# Altium footprint library CONN_B2B.PcbLib: 30 footprints (part 2 of 2) (continued)
## QTE_060_03 [mm] "samtec 0.80 mm Q Strip® High Speed Ground Plane Terminal Strip"
pads (134):
  oval 0.4x2.4 smd: 1(-27.6,3) 2(-27.6,-3) 3(-26.8,3) 4(-26.8,-3) 5(-26,3) 6(-26,-3) 7(-25.2,3) 8(-25.2,-3) 9(-24.4,3) 10(-24.4,-3) 11(-23.6,3) 12(-23.6,-3) 13(-22.8,3) 14(-22.8,-3) 15(-22,3) 16(-22,-3) 17(-21.2,3) 18(-21.2,-3) 19(-20.4,3) 20(-20.4,-3) 21(-19.6,3) 22(-19.6,-3) 23(-18.8,3) 24(-18.8,-3) 25(-18,3) 26(-18,-3) 27(-17.2,3) 28(-17.2,-3) 29(-16.4,3) 30(-16.4,-3) 31(-15.6,3) 32(-15.6,-3) 33(-14.8,3) 34(-14.8,-3) 35(-14,3) 36(-14,-3) 37(-13.2,3) 38(-13.2,-3) 39(-12.4,3) 40(-12.4,-3) 41(-7.6,3) 42(-7.6,-3) 43(-6.8,3) 44(-6.8,-3) 45(-6,3) 46(-6,-3) 47(-5.2,3) 48(-5.2,-3) 49(-4.4,3) 50(-4.4,-3) 51(-3.6,3) 52(-3.6,-3) 53(-2.8,3) 54(-2.8,-3) 55(-2,3) 56(-2,-3) 57(-1.2,3) 58(-1.2,-3) 59(-0.4,3) 60(-0.4,-3) 61(0.4,3) 62(0.4,-3) 63(1.2,3) 64(1.2,-3) 65(2,3) 66(2,-3) 67(2.8,3) 68(2.8,-3) 69(3.6,3) 70(3.6,-3) 71(4.4,3) 72(4.4,-3) 73(5.2,3) 74(5.2,-3) 75(6,3) 76(6,-3) 77(6.8,3) 78(6.8,-3) 79(7.6,3) 80(7.6,-3) 81(12.4,3) 82(12.4,-3) 83(13.2,3) 84(13.2,-3) 85(14,3) 86(14,-3) 87(14.8,3) 88(14.8,-3) 89(15.6,3) 90(15.6,-3) 91(16.4,3) 92(16.4,-3) 93(17.2,3) 94(17.2,-3) 95(18,3) 96(18,-3) 97(18.8,3) 98(18.8,-3) 99(19.6,3) 100(19.6,-3) 101(20.4,3) 102(20.4,-3) 103(21.2,3) 104(21.2,-3) 105(22,3) 106(22,-3) 107(22.8,3) 108(22.8,-3) 109(23.6,3) 110(23.6,-3) 111(24.4,3) 112(24.4,-3) 113(25.2,3) 114(25.2,-3) 115(26,3) 116(26,-3) 117(26.8,3) 118(26.8,-3) 119(27.6,3) 120(27.6,-3)
  oval 3x1 smd mask+0.1: 121(-28.1,0) 124(-12,0) 125(-8.2,0) 128(8.2,0) 129(12,0) 132(28.1,0)
  oval 5x1 smd mask+0.1: 122(-23.2,0) 123(-16.9,0) 126(-3.3,0) 127(3.3,0) 130(16.9,0) 131(23.2,0)
  round 1 hole 1 unplated: ""(-29.2,2.1) ""(29.2,2.1)
Top Overlay:
  circle w0.2: c-28.3,3.7 r0.2
  lines w0.2: -28,-3.1 -28.4,-3.1 -30.1,-1.4 -30.1,3.1 -28,3.1 ; -11.95,-3.1 -8.05,-3.1 ; -11.95,3.1 -8.05,3.1 ; 8.05,-3.1 11.95,-3.1 ; 8.05,3.1 11.95,3.1 ; 28,-3.1 28.4,-3.1 30.1,-1.4 30.1,3.1 28,3.1
Mechanical 13:
  lines w0.1: -30,-1.1 -30,3 30,3 30,-1.1 28.1,-3 -28.1,-3 -30,-1.1
3D body "Samtec-QTE-060-03-L-D-A.step": height 10.26, standoff -0.71, extent -30,-3.456 30.008,3.656

## QTH_030_01 [mm] "samtec 0.50 mm Q Strip® High Speed Ground Plane Terminal Strip"
pads (66):
  oval 0.25x1.6 smd mask+0.05: 1(-7.25,3.2) 2(-7.25,-3.2) 3(-6.75,3.2) 4(-6.75,-3.2) 5(-6.25,3.2) 6(-6.25,-3.2) 7(-5.75,3.2) 8(-5.75,-3.2) 9(-5.25,3.2) 10(-5.25,-3.2) 11(-4.75,3.2) 12(-4.75,-3.2) 13(-4.25,3.2) 14(-4.25,-3.2) 15(-3.75,3.2) 16(-3.75,-3.2) 17(-3.25,3.2) 18(-3.25,-3.2) 19(-2.75,3.2) 20(-2.75,-3.2) 21(-2.25,3.2) 22(-2.25,-3.2) 23(-1.75,3.2) 24(-1.75,-3.2) 25(-1.25,3.2) 26(-1.25,-3.2) 27(-0.75,3.2) 28(-0.75,-3.2) 29(-0.25,3.2) 30(-0.25,-3.2) 31(0.25,3.2) 32(0.25,-3.2) 33(0.75,3.2) 34(0.75,-3.2) 35(1.25,3.2) 36(1.25,-3.2) 37(1.75,3.2) 38(1.75,-3.2) 39(2.25,3.2) 40(2.25,-3.2) 41(2.75,3.2) 42(2.75,-3.2) 43(3.25,3.2) 44(3.25,-3.2) 45(3.75,3.2) 46(3.75,-3.2) 47(4.25,3.2) 48(4.25,-3.2) 49(4.75,3.2) 50(4.75,-3.2) 51(5.25,3.2) 52(5.25,-3.2) 53(5.75,3.2) 54(5.75,-3.2) 55(6.25,3.2) 56(6.25,-3.2) 57(6.75,3.2) 58(6.75,-3.2) 59(7.25,3.2) 60(7.25,-3.2)
  oval 2.5x0.6 smd mask+0.1: 61(-8.445,0) 64(8.445,0)
  oval 5x0.6 smd mask+0.1: 62(-3.175,0) 63(3.175,0)
  round 1 hole 1 unplated: ""(-9.25,2) ""(9.25,2)
Top Overlay:
  circle w0.2: c-8.3,3.7 r0.2
  lines w0.2: -7.6,-3.2 -8.4,-3.2 -10.2,-1.4 -10.2,3.2 -7.6,3.2 ; 7.5,-3.2 8.3,-3.2 10.2,-1.3 10.2,3.2 7.6,3.2
  text "2" at -8,-4.1 h0.6
  text "1" at -7.9,3.5 h0.6
Mechanical 15:
  lines w0.254: -10,-1.285 -10,2.985 10,2.985 10,-1.185 8.2,-2.985 -8.3,-2.985 -10,-1.285
3D body "Samtec-QTH-030-01-L-D-A.step": height 4.31, standoff -0.69, extent -10.001,-3.556 10.001,3.556

## QTH_030_04 [mm] "samtec 0.50 mm Q Strip® High Speed Ground Plane Terminal Strip"
height 1.2
pads (66):
  oval 0.3x1.6 smd paste-0.065 mask+0.05: 1(-7.25,3.1) 2(-7.25,-3.1) 3(-6.75,3.1) 4(-6.75,-3.1) 5(-6.25,3.1) 6(-6.25,-3.1) 7(-5.75,3.1) 8(-5.75,-3.1) 9(-5.25,3.1) 10(-5.25,-3.1) 11(-4.75,3.1) 12(-4.75,-3.1) 13(-4.25,3.1) 14(-4.25,-3.1) 15(-3.75,3.1) 16(-3.75,-3.1) 17(-3.25,3.1) 18(-3.25,-3.1) 19(-2.75,3.1) 20(-2.75,-3.1) 21(-2.25,3.1) 22(-2.25,-3.1) 23(-1.75,3.1) 24(-1.75,-3.1) 25(-1.25,3.1) 26(-1.25,-3.1) 27(-0.75,3.1) 28(-0.75,-3.1) 29(-0.25,3.1) 30(-0.25,-3.1) 31(0.25,3.1) 32(0.25,-3.1) 33(0.75,3.1) 34(0.75,-3.1) 35(1.25,3.1) 36(1.25,-3.1) 37(1.75,3.1) 38(1.75,-3.1) 39(2.25,3.1) 40(2.25,-3.1) 41(2.75,3.1) 42(2.75,-3.1) 43(3.25,3.1) 44(3.25,-3.1) 45(3.75,3.1) 46(3.75,-3.1) 47(4.25,3.1) 48(4.25,-3.1) 49(4.75,3.1) 50(4.75,-3.1) 51(5.25,3.1) 52(5.25,-3.1) 53(5.75,3.1) 54(5.75,-3.1) 55(6.25,3.1) 56(6.25,-3.1) 57(6.75,3.1) 58(6.75,-3.1) 59(7.25,3.1) 60(7.25,-3.1)
  oval 2.5x0.6 smd mask+0.1: 61(-8.45,0) 64(8.45,0)
  oval 5x0.6 smd mask+0.1: 62(-3.175,0) 63(3.175,0)
  round 1 hole 1 unplated: ""(-9.24,2.03) ""(9.24,2.03)
Top Overlay:
  lines w0.2: -7.6,-3.7 -10.1,-3.7 -10.1,3.7 -7.6,3.7 ; 7.6,-3.7 10.1,-3.7 10.1,3.7 7.6,3.7
  text "2" at -7.9,-4.6 h0.6
  text "1" at -7.8,4 h0.6
3D body "QTH-030-04-L-D-A.stp": height 15.24, standoff -0.77, extent -10,-3.562 10.015,3.55

## QTH_060_01 [mm] "samtec 0.50 mm Q Strip® High Speed Ground Plane Terminal Strip"
pads (130):
  oval 0.25x1.6 smd mask+0.05: 1(-17.25,3.2) 2(-17.25,-3.2) 3(-16.75,3.2) 4(-16.75,-3.2) 5(-16.25,3.2) 6(-16.25,-3.2) 7(-15.75,3.2) 8(-15.75,-3.2) 9(-15.25,3.2) 10(-15.25,-3.2) 11(-14.75,3.2) 12(-14.75,-3.2) 13(-14.25,3.2) 14(-14.25,-3.2) 15(-13.75,3.2) 16(-13.75,-3.2) 17(-13.25,3.2) 18(-13.25,-3.2) 19(-12.75,3.2) 20(-12.75,-3.2) 21(-12.25,3.2) 22(-12.25,-3.2) 23(-11.75,3.2) 24(-11.75,-3.2) 25(-11.25,3.2) 26(-11.25,-3.2) 27(-10.75,3.2) 28(-10.75,-3.2) 29(-10.25,3.2) 30(-10.25,-3.2) 31(-9.75,3.2) 32(-9.75,-3.2) 33(-9.25,3.2) 34(-9.25,-3.2) 35(-8.75,3.2) 36(-8.75,-3.2) 37(-8.25,3.2) 38(-8.25,-3.2) 39(-7.75,3.2) 40(-7.75,-3.2) 41(-7.25,3.2) 42(-7.25,-3.2) 43(-6.75,3.2) 44(-6.75,-3.2) 45(-6.25,3.2) 46(-6.25,-3.2) 47(-5.75,3.2) 48(-5.75,-3.2) 49(-5.25,3.2) 50(-5.25,-3.2) 51(-4.75,3.2) 52(-4.75,-3.2) 53(-4.25,3.2) 54(-4.25,-3.2) 55(-3.75,3.2) 56(-3.75,-3.2) 57(-3.25,3.2) 58(-3.25,-3.2) 59(-2.75,3.2) 60(-2.75,-3.2) 61(2.75,3.2) 62(2.75,-3.2) 63(3.25,3.2) 64(3.25,-3.2) 65(3.75,3.2) 66(3.75,-3.2) 67(4.25,3.2) 68(4.25,-3.2) 69(4.75,3.2) 70(4.75,-3.2) 71(5.25,3.2) 72(5.25,-3.2) 73(5.75,3.2) 74(5.75,-3.2) 75(6.25,3.2) 76(6.25,-3.2) 77(6.75,3.2) 78(6.75,-3.2) 79(7.25,3.2) 80(7.25,-3.2) 81(7.75,3.2) 82(7.75,-3.2) 83(8.25,3.2) 84(8.25,-3.2) 85(8.75,3.2) 86(8.75,-3.2) 87(9.25,3.2) 88(9.25,-3.2) 89(9.75,3.2) 90(9.75,-3.2) 91(10.25,3.2) 92(10.25,-3.2) 93(10.75,3.2) 94(10.75,-3.2) 95(11.25,3.2) 96(11.25,-3.2) 97(11.75,3.2) 98(11.75,-3.2) 99(12.25,3.2) 100(12.25,-3.2) 101(12.75,3.2) 102(12.75,-3.2) 103(13.25,3.2) 104(13.25,-3.2) 105(13.75,3.2) 106(13.75,-3.2) 107(14.25,3.2) 108(14.25,-3.2) 109(14.75,3.2) 110(14.75,-3.2) 111(15.25,3.2) 112(15.25,-3.2) 113(15.75,3.2) 114(15.75,-3.2) 115(16.25,3.2) 116(16.25,-3.2) 117(16.75,3.2) 118(16.75,-3.2) 119(17.25,3.2) 120(17.25,-3.2)
  oval 2.5x0.6 smd mask+0.1: 121(-18.445,0) 124(-1.555,0) 125(1.555,0) 128(18.445,0)
  oval 5x0.6 smd mask+0.1: 122(-13.175,0) 123(-6.825,0) 126(6.825,0) 127(13.175,0)
  round 1 hole 1 unplated: ""(-19.25,2) ""(19.25,2)
Top Overlay:
  circle w0.2: c-18.2,3.7 r0.2
  lines w0.2: -17.6,-3.2 -18.6,-3.2 -20.2,-1.6 -20.2,3.2 -17.6,3.2 ; -2.4,-3.2 2.4,-3.2 ; -2.4,3.2 2.4,3.2 ; 17.6,-3.2 18.6,-3.2 20.2,-1.6 20.2,3.2 17.6,3.2
  text "2" at -17.98,-4.057 h0.6
  text "1" at -17.8,3.5 h0.6
Mechanical 15:
  lines w0.254: -20.005,-1.461 -20.005,2.985 20.005,2.985 20.005,-1.461 18.481,-2.985 -18.481,-2.985 -20.005,-1.461
3D body "Samtec-QTH-060-01-L-D-A.step": height 4.31, standoff -0.69, extent -20.003,-3.556 20.002,3.556

## QTH_090_01 [mm] "samtec 0.50 mm Q Strip® High Speed Ground Plane Terminal Strip"
pads (194):
  oval 0.25x1.6 smd mask+0.05: 1(-27.25,3.2) 2(-27.25,-3.2) 3(-26.75,3.2) 4(-26.75,-3.2) 5(-26.25,3.2) 6(-26.25,-3.2) 7(-25.75,3.2) 8(-25.75,-3.2) 9(-25.25,3.2) 10(-25.25,-3.2) 11(-24.75,3.2) 12(-24.75,-3.2) 13(-24.25,3.2) 14(-24.25,-3.2) 15(-23.75,3.2) 16(-23.75,-3.2) 17(-23.25,3.2) 18(-23.25,-3.2) 19(-22.75,3.2) 20(-22.75,-3.2) 21(-22.25,3.2) 22(-22.25,-3.2) 23(-21.75,3.2) 24(-21.75,-3.2) 25(-21.25,3.2) 26(-21.25,-3.2) 27(-20.75,3.2) 28(-20.75,-3.2) 29(-20.25,3.2) 30(-20.25,-3.2) 31(-19.75,3.2) 32(-19.75,-3.2) 33(-19.25,3.2) 34(-19.25,-3.2) 35(-18.75,3.2) 36(-18.75,-3.2) 37(-18.25,3.2) 38(-18.25,-3.2) 39(-17.75,3.2) 40(-17.75,-3.2) 41(-17.25,3.2) 42(-17.25,-3.2) 43(-16.75,3.2) 44(-16.75,-3.2) 45(-16.25,3.2) 46(-16.25,-3.2) 47(-15.75,3.2) 48(-15.75,-3.2) 49(-15.25,3.2) 50(-15.25,-3.2) 51(-14.75,3.2) 52(-14.75,-3.2) 53(-14.25,3.2) 54(-14.25,-3.2) 55(-13.75,3.2) 56(-13.75,-3.2) 57(-13.25,3.2) 58(-13.25,-3.2) 59(-12.75,3.2) 60(-12.75,-3.2) 61(-7.25,3.2) 62(-7.25,-3.2) 63(-6.75,3.2) 64(-6.75,-3.2) 65(-6.25,3.2) 66(-6.25,-3.2) 67(-5.75,3.2) 68(-5.75,-3.2) 69(-5.25,3.2) 70(-5.25,-3.2) 71(-4.75,3.2) 72(-4.75,-3.2) 73(-4.25,3.2) 74(-4.25,-3.2) 75(-3.75,3.2) 76(-3.75,-3.2) 77(-3.25,3.2) 78(-3.25,-3.2) 79(-2.75,3.2) 80(-2.75,-3.2) 81(-2.25,3.2) 82(-2.25,-3.2) 83(-1.75,3.2) 84(-1.75,-3.2) 85(-1.25,3.2) 86(-1.25,-3.2) 87(-0.75,3.2) 88(-0.75,-3.2) 89(-0.25,3.2) 90(-0.25,-3.2) 91(0.25,3.2) 92(0.25,-3.2) 93(0.75,3.2) 94(0.75,-3.2) 95(1.25,3.2) 96(1.25,-3.2) 97(1.75,3.2) 98(1.75,-3.2) 99(2.25,3.2) 100(2.25,-3.2) 101(2.75,3.2) 102(2.75,-3.2) 103(3.25,3.2) 104(3.25,-3.2) 105(3.75,3.2) 106(3.75,-3.2) 107(4.25,3.2) 108(4.25,-3.2) 109(4.75,3.2) 110(4.75,-3.2) 111(5.25,3.2) 112(5.25,-3.2) 113(5.75,3.2) 114(5.75,-3.2) 115(6.25,3.2) 116(6.25,-3.2) 117(6.75,3.2) 118(6.75,-3.2) 119(7.25,3.2) 120(7.25,-3.2) 121(12.75,3.2) 122(12.75,-3.2) 123(13.25,3.2) 124(13.25,-3.2) 125(13.75,3.2) 126(13.75,-3.2) 127(14.25,3.2) 128(14.25,-3.2) 129(14.75,3.2) 130(14.75,-3.2) 131(15.25,3.2) 132(15.25,-3.2) 133(15.75,3.2) 134(15.75,-3.2) 135(16.25,3.2) 136(16.25,-3.2) 137(16.75,3.2) 138(16.75,-3.2) 139(17.25,3.2) 140(17.25,-3.2) 141(17.75,3.2) 142(17.75,-3.2) 143(18.25,3.2) 144(18.25,-3.2) 145(18.75,3.2) 146(18.75,-3.2) 147(19.25,3.2) 148(19.25,-3.2) 149(19.75,3.2) 150(19.75,-3.2) 151(20.25,3.2) 152(20.25,-3.2) 153(20.75,3.2) 154(20.75,-3.2) 155(21.25,3.2) 156(21.25,-3.2) 157(21.75,3.2) 158(21.75,-3.2) 159(22.25,3.2) 160(22.25,-3.2) 161(22.75,3.2) 162(22.75,-3.2) 163(23.25,3.2) 164(23.25,-3.2) 165(23.75,3.2) 166(23.75,-3.2) 167(24.25,3.2) 168(24.25,-3.2) 169(24.75,3.2) 170(24.75,-3.2) 171(25.25,3.2) 172(25.25,-3.2) 173(25.75,3.2) 174(25.75,-3.2) 175(26.25,3.2) 176(26.25,-3.2) 177(26.75,3.2) 178(26.75,-3.2) 179(27.25,3.2) 180(27.25,-3.2)
  oval 2.5x0.6 smd mask+0.1: 181(-28.445,0) 184(-11.555,0) 185(-8.445,0) 188(8.445,0) 189(11.555,0) 192(28.445,0)
  oval 5x0.6 smd mask+0.1: 182(-23.175,0) 183(-16.825,0) 186(-3.175,0) 187(3.175,0) 190(16.825,0) 191(23.175,0)
  round 1 hole 1 unplated: ""(-29.25,2) ""(29.25,2)
Top Overlay:
  circle w0.2: c-28.2,3.7 r0.2
  lines w0.2: -27.6,-3.1 -28.5,-3.1 -30.1,-1.5 -30.1,3.1 -27.6,3.1 ; -12.4,-3.1 -7.6,-3.1 ; -12.4,3.1 -7.6,3.1 ; 7.6,-3.1 12.4,-3.1 ; 7.6,3.1 12.4,3.1 ; 27.6,-3.1 28.5,-3.1 30.1,-1.5 30.1,3.1 27.6,3.1
  text "1" at -27.8,3.5 h0.6
  text "2" at -27.98,-4.057 h0.6
Mechanical 15:
  lines w0.254: -30.005,-1.461 -28.481,-2.985 28.481,-2.985 30.005,-1.461 30.005,2.985 -30.005,2.985 -30.005,-1.461
3D body "QTH-090-01-F-D-A.stp": height 4.26, standoff -0.77, extent -30.01,-3.556 30.01,3.556

## QTH_090_01A [mm] "samtec 0.50 mm Q Strip® High Speed Ground Plane Terminal Strip"
pads (194):
  oval 0.25x1.2 smd mask+0.05: 1(-27.25,3) 2(-27.25,-3) 3(-26.75,3) 4(-26.75,-3) 5(-26.25,3) 6(-26.25,-3) 7(-25.75,3) 8(-25.75,-3) 9(-25.25,3) 10(-25.25,-3) 11(-24.75,3) 12(-24.75,-3) 13(-24.25,3) 14(-24.25,-3) 15(-23.75,3) 16(-23.75,-3) 17(-23.25,3) 18(-23.25,-3) 19(-22.75,3) 20(-22.75,-3) 21(-22.25,3) 22(-22.25,-3) 23(-21.75,3) 24(-21.75,-3) 25(-21.25,3) 26(-21.25,-3) 27(-20.75,3) 28(-20.75,-3) 29(-20.25,3) 30(-20.25,-3) 31(-19.75,3) 32(-19.75,-3) 33(-19.25,3) 34(-19.25,-3) 35(-18.75,3) 36(-18.75,-3) 37(-18.25,3) 38(-18.25,-3) 39(-17.75,3) 40(-17.75,-3) 41(-17.25,3) 42(-17.25,-3) 43(-16.75,3) 44(-16.75,-3) 45(-16.25,3) 46(-16.25,-3) 47(-15.75,3) 48(-15.75,-3) 49(-15.25,3) 50(-15.25,-3) 51(-14.75,3) 52(-14.75,-3) 53(-14.25,3) 54(-14.25,-3) 55(-13.75,3) 56(-13.75,-3) 57(-13.25,3) 58(-13.25,-3) 59(-12.75,3) 60(-12.75,-3) 61(-7.25,3) 62(-7.25,-3) 63(-6.75,3) 64(-6.75,-3) 65(-6.25,3) 66(-6.25,-3) 67(-5.75,3) 68(-5.75,-3) 69(-5.25,3) 70(-5.25,-3) 71(-4.75,3) 72(-4.75,-3) 73(-4.25,3) 74(-4.25,-3) 75(-3.75,3) 76(-3.75,-3) 77(-3.25,3) 78(-3.25,-3) 79(-2.75,3) 80(-2.75,-3) 81(-2.25,3) 82(-2.25,-3) 83(-1.75,3) 84(-1.75,-3) 85(-1.25,3) 86(-1.25,-3) 87(-0.75,3) 88(-0.75,-3) 89(-0.25,3) 90(-0.25,-3) 91(0.25,3) 92(0.25,-3) 93(0.75,3) 94(0.75,-3) 95(1.25,3) 96(1.25,-3) 97(1.75,3) 98(1.75,-3) 99(2.25,3) 100(2.25,-3) 101(2.75,3) 102(2.75,-3) 103(3.25,3) 104(3.25,-3) 105(3.75,3) 106(3.75,-3) 107(4.25,3) 108(4.25,-3) 109(4.75,3) 110(4.75,-3) 111(5.25,3) 112(5.25,-3) 113(5.75,3) 114(5.75,-3) 115(6.25,3) 116(6.25,-3) 117(6.75,3) 118(6.75,-3) 119(7.25,3) 120(7.25,-3) 121(12.75,3) 122(12.75,-3) 123(13.25,3) 124(13.25,-3) 125(13.75,3) 126(13.75,-3) 127(14.25,3) 128(14.25,-3) 129(14.75,3) 130(14.75,-3) 131(15.25,3) 132(15.25,-3) 133(15.75,3) 134(15.75,-3) 135(16.25,3) 136(16.25,-3) 137(16.75,3) 138(16.75,-3) 139(17.25,3) 140(17.25,-3) 141(17.75,3) 142(17.75,-3) 143(18.25,3) 144(18.25,-3) 145(18.75,3) 146(18.75,-3) 147(19.25,3) 148(19.25,-3) 149(19.75,3) 150(19.75,-3) 151(20.25,3) 152(20.25,-3) 153(20.75,3) 154(20.75,-3) 155(21.25,3) 156(21.25,-3) 157(21.75,3) 158(21.75,-3) 159(22.25,3) 160(22.25,-3) 161(22.75,3) 162(22.75,-3) 163(23.25,3) 164(23.25,-3) 165(23.75,3) 166(23.75,-3) 167(24.25,3) 168(24.25,-3) 169(24.75,3) 170(24.75,-3) 171(25.25,3) 172(25.25,-3) 173(25.75,3) 174(25.75,-3) 175(26.25,3) 176(26.25,-3) 177(26.75,3) 178(26.75,-3) 179(27.25,3) 180(27.25,-3)
  oval 2.5x0.5 smd mask+0.1: 181(-28.445,0) 184(-11.555,0) 185(-8.445,0) 188(8.445,0) 189(11.555,0) 192(28.445,0)
  oval 5x0.5 smd mask+0.1: 182(-23.175,0) 183(-16.825,0) 186(-3.175,0) 187(3.175,0) 190(16.825,0) 191(23.175,0)
  round 1 hole 1 unplated: ""(-29.25,2) ""(29.25,2)
Top Overlay:
  circle w0.2: c-28.2,3.7 r0.2
  lines w0.2: -27.6,-3.1 -28.5,-3.1 -30.1,-1.5 -30.1,3.1 -27.6,3.1 ; -12.4,-3.1 -7.6,-3.1 ; -12.4,3.1 -7.6,3.1 ; 7.6,-3.1 12.4,-3.1 ; 7.6,3.1 12.4,3.1 ; 27.6,-3.1 28.5,-3.1 30.1,-1.5 30.1,3.1 27.6,3.1
  text "1" at -27.8,3.5 h0.6
  text "2" at -27.98,-4.057 h0.6
Mechanical 15:
  lines w0.254: -30.005,-1.461 -28.481,-2.985 28.481,-2.985 30.005,-1.461 30.005,2.985 -30.005,2.985 -30.005,-1.461
3D body "QTH-090-01-F-D-A.stp": height 4.26, standoff -0.77, extent -30.01,-3.556 30.01,3.556

## SEAF8_20_S_10 [mm] "CONN, B2B, SAMTEC, SEAF8-20-05.0-S-10-2-K"
pads (402):
  round 0.5 smd paste+0.064 mask+0.05: A1(-7.6,4.6) A2(-6.8,4.6) A3(-6,4.6) A4(-5.2,4.6) A5(-4.4,4.6) A6(-3.6,4.6) A7(-2.8,4.6) A8(-2,4.6) A9(-1.2,4.6) A10(-0.4,4.6) A11(0.4,4.6) A12(1.2,4.6) A13(2,4.6) A14(2.8,4.6) A15(3.6,4.6) A16(4.4,4.6) A17(5.2,4.6) A18(6,4.6) A19(6.8,4.6) A20(7.6,4.6) B1(-7.6,3.4) B2(-6.8,3.4) B3(-6,3.4) B4(-5.2,3.4) B5(-4.4,3.4) B6(-3.6,3.4) B7(-2.8,3.4) B8(-2,3.4) B9(-1.2,3.4) B10(-0.4,3.4) B11(0.4,3.4) B12(1.2,3.4) B13(2,3.4) B14(2.8,3.4) B15(3.6,3.4) B16(4.4,3.4) B17(5.2,3.4) B18(6,3.4) B19(6.8,3.4) B20(7.6,3.4) C1(-7.6,2.6) C2(-6.8,2.6) C3(-6,2.6) C4(-5.2,2.6) C5(-4.4,2.6) C6(-3.6,2.6) C7(-2.8,2.6) C8(-2,2.6) C9(-1.2,2.6) C10(-0.4,2.6) C11(0.4,2.6) C12(1.2,2.6) C13(2,2.6) C14(2.8,2.6) C15(3.6,2.6) C16(4.4,2.6) C17(5.2,2.6) C18(6,2.6) C19(6.8,2.6) C20(7.6,2.6) D1(-7.6,1.4) D2(-6.8,1.4) D3(-6,1.4) D4(-5.2,1.4) D5(-4.4,1.4) D6(-3.6,1.4) D7(-2.8,1.4) D8(-2,1.4) D9(-1.2,1.4) D10(-0.4,1.4) D11(0.4,1.4) D12(1.2,1.4) D13(2,1.4) D14(2.8,1.4) D15(3.6,1.4) D16(4.4,1.4) D17(5.2,1.4) D18(6,1.4) D19(6.8,1.4) D20(7.6,1.4) E1(-7.6,0.6) E2(-6.8,0.6) E3(-6,0.6) E4(-5.2,0.6) E5(-4.4,0.6) E6(-3.6,0.6) E7(-2.8,0.6) E8(-2,0.6) E9(-1.2,0.6) E10(-0.4,0.6) E11(0.4,0.6) E12(1.2,0.6) E13(2,0.6) E14(2.8,0.6) E15(3.6,0.6) E16(4.4,0.6) E17(5.2,0.6) E18(6,0.6) E19(6.8,0.6) E20(7.6,0.6) F1(-7.6,-0.6) F2(-6.8,-0.6) F3(-6,-0.6) F4(-5.2,-0.6) F5(-4.4,-0.6) F6(-3.6,-0.6) F7(-2.8,-0.6) F8(-2,-0.6) F9(-1.2,-0.6) F10(-0.4,-0.6) F11(0.4,-0.6) F12(1.2,-0.6) F13(2,-0.6) F14(2.8,-0.6) F15(3.6,-0.6) F16(4.4,-0.6) F17(5.2,-0.6) F18(6,-0.6) F19(6.8,-0.6) F20(7.6,-0.6) G1(-7.6,-1.4) G2(-6.8,-1.4) G3(-6,-1.4) G4(-5.2,-1.4) G5(-4.4,-1.4) G6(-3.6,-1.4) G7(-2.8,-1.4) G8(-2,-1.4) G9(-1.2,-1.4) G10(-0.4,-1.4) G11(0.4,-1.4) G12(1.2,-1.4) G13(2,-1.4) G14(2.8,-1.4) G15(3.6,-1.4) G16(4.4,-1.4) G17(5.2,-1.4) G18(6,-1.4) G19(6.8,-1.4) G20(7.6,-1.4) H1(-7.6,-2.6) H2(-6.8,-2.6) H3(-6,-2.6) H4(-5.2,-2.6) H5(-4.4,-2.6) H6(-3.6,-2.6) H7(-2.8,-2.6) H8(-2,-2.6) H9(-1.2,-2.6) H10(-0.4,-2.6) H11(0.4,-2.6) H12(1.2,-2.6) H13(2,-2.6) H14(2.8,-2.6) H15(3.6,-2.6) H16(4.4,-2.6) H17(5.2,-2.6) H18(6,-2.6) H19(6.8,-2.6) H20(7.6,-2.6) J1(-7.6,-3.4) J2(-6.8,-3.4) J3(-6,-3.4) J4(-5.2,-3.4) J5(-4.4,-3.4) J6(-3.6,-3.4) J7(-2.8,-3.4) J8(-2,-3.4) J9(-1.2,-3.4) J10(-0.4,-3.4) J11(0.4,-3.4) J12(1.2,-3.4) J13(2,-3.4) J14(2.8,-3.4) J15(3.6,-3.4) J16(4.4,-3.4) J17(5.2,-3.4) J18(6,-3.4) J19(6.8,-3.4) J20(7.6,-3.4) K1(-7.6,-4.6) K2(-6.8,-4.6) K3(-6,-4.6) K4(-5.2,-4.6) K5(-4.4,-4.6) K6(-3.6,-4.6) K7(-2.8,-4.6) K8(-2,-4.6) K9(-1.2,-4.6) K10(-0.4,-4.6) K11(0.4,-4.6) K12(1.2,-4.6) K13(2,-4.6) K14(2.8,-4.6) K15(3.6,-4.6) K16(4.4,-4.6) K17(5.2,-4.6) K18(6,-4.6) K19(6.8,-4.6) K20(7.6,-4.6)
  round 0 hole 1.5 unplated: ""(-9.3,-2.3) ""(9.3,0)
  oval 0.65x0.7 on Top Paste: ""(-7.6,-4.55) ""(-7.6,-3.45) ""(-7.6,-2.55) ""(-7.6,-1.45) ""(-7.6,-0.55) ""(-7.6,0.55) ""(-7.6,1.45) ""(-7.6,2.55) ""(-7.6,3.45) ""(-7.6,4.55) ""(-6.8,-4.55) ""(-6.8,-3.45) ""(-6.8,-2.55) ""(-6.8,-1.45) ""(-6.8,-0.55) ""(-6.8,0.55) ""(-6.8,1.45) ""(-6.8,2.55) ""(-6.8,3.45) ""(-6.8,4.55) ""(-6,-4.55) ""(-6,-3.45) ""(-6,-2.55) ""(-6,-1.45) ""(-6,-0.55) ""(-6,0.55) ""(-6,1.45) ""(-6,2.55) ""(-6,3.45) ""(-6,4.55) ""(-5.2,-4.55) ""(-5.2,-3.45) ""(-5.2,-2.55) ""(-5.2,-1.45) ""(-5.2,-0.55) ""(-5.2,0.55) ""(-5.2,1.45) ""(-5.2,2.55) ""(-5.2,3.45) ""(-5.2,4.55) ""(-4.4,-4.55) ""(-4.4,-3.45) ""(-4.4,-2.55) ""(-4.4,-1.45) ""(-4.4,-0.55) ""(-4.4,0.55) ""(-4.4,1.45) ""(-4.4,2.55) ""(-4.4,3.45) ""(-4.4,4.55) ""(-3.6,-4.55) ""(-3.6,-3.45) ""(-3.6,-2.55) ""(-3.6,-1.45) ""(-3.6,-0.55) ""(-3.6,0.55) ""(-3.6,1.45) ""(-3.6,2.55) ""(-3.6,3.45) ""(-3.6,4.55) ""(-2.8,-4.55) ""(-2.8,-3.45) ""(-2.8,-2.55) ""(-2.8,-1.45) ""(-2.8,-0.55) ""(-2.8,0.55) ""(-2.8,1.45) ""(-2.8,2.55) ""(-2.8,3.45) ""(-2.8,4.55) ""(-2,-4.55) ""(-2,-3.45) ""(-2,-2.55) ""(-2,-1.45) ""(-2,-0.55) ""(-2,0.55) ""(-2,1.45) ""(-2,2.55) ""(-2,3.45) ""(-2,4.55) ""(-1.2,-4.55) ""(-1.2,-3.45) ""(-1.2,-2.55) ""(-1.2,-1.45) ""(-1.2,-0.55) ""(-1.2,0.55) ""(-1.2,1.45) ""(-1.2,2.55) ""(-1.2,3.45) ""(-1.2,4.55) ""(-0.4,-4.55) ""(-0.4,-3.45) ""(-0.4,-2.55) ""(-0.4,-1.45) ""(-0.4,-0.55) ""(-0.4,0.55) ""(-0.4,1.45) ""(-0.4,2.55) ""(-0.4,3.45) ""(-0.4,4.55) ""(0.4,-4.55) ""(0.4,-3.45) ""(0.4,-2.55) ""(0.4,-1.45) ""(0.4,-0.55) ""(0.4,0.55) ""(0.4,1.45) ""(0.4,2.55) ""(0.4,3.45) ""(0.4,4.55) ""(1.2,-4.55) ""(1.2,-3.45) ""(1.2,-2.55) ""(1.2,-1.45) ""(1.2,-0.55) ""(1.2,0.55) ""(1.2,1.45) ""(1.2,2.55) ""(1.2,3.45) ""(1.2,4.55) ""(2,-4.55) ""(2,-3.45) ""(2,-2.55) ""(2,-1.45) ""(2,-0.55) ""(2,0.55) ""(2,1.45) ""(2,2.55) ""(2,3.45) ""(2,4.55) ""(2.8,-4.55) ""(2.8,-3.45) ""(2.8,-2.55) ""(2.8,-1.45) ""(2.8,-0.55) ""(2.8,0.55) ""(2.8,1.45) ""(2.8,2.55) ""(2.8,3.45) ""(2.8,4.55) ""(3.6,-4.55) ""(3.6,-3.45) ""(3.6,-2.55) ""(3.6,-1.45) ""(3.6,-0.55) ""(3.6,0.55) ""(3.6,1.45) ""(3.6,2.55) ""(3.6,3.45) ""(3.6,4.55) ""(4.4,-4.55) ""(4.4,-3.45) ""(4.4,-2.55) ""(4.4,-1.45) ""(4.4,-0.55) ""(4.4,0.55) ""(4.4,1.45) ""(4.4,2.55) ""(4.4,3.45) ""(4.4,4.55) ""(5.2,-4.55) ""(5.2,-3.45) ""(5.2,-2.55) ""(5.2,-1.45) ""(5.2,-0.55) ""(5.2,0.55) ""(5.2,1.45) ""(5.2,2.55) ""(5.2,3.45) ""(5.2,4.55) ""(6,-4.55) ""(6,-3.45) ""(6,-2.55) ""(6,-1.45) ""(6,-0.55) ""(6,0.55) ""(6,1.45) ""(6,2.55) ""(6,3.45) ""(6,4.55) ""(6.8,-4.55) ""(6.8,-3.45) ""(6.8,-2.55) ""(6.8,-1.45) ""(6.8,-0.55) ""(6.8,0.55) ""(6.8,1.45) ""(6.8,2.55) ""(6.8,3.45) ""(6.8,4.55) ""(7.6,-4.55) ""(7.6,-3.45) ""(7.6,-2.55) ""(7.6,-1.45) ""(7.6,-0.55) ""(7.6,0.55) ""(7.6,1.45) ""(7.6,2.55) ""(7.6,3.45) ""(7.6,4.55)
Top Overlay:
  lines w0.2: -11,-6 -11,6 -9.3,6 -9.3,5.3 9.3,5.3 9.3,6 11,6 11,-6 9.3,-6 9.3,-5.3 -9.3,-5.3 -9.3,-6 -11,-6
3D body "SEAF8-20-05.0-S-10-2-K.stp": height 4.65, standoff -1.32, extent -10.92,-5.9 10.92,5.9

## SOLC_15Q [mm] "SAMTEC SOLC-115-02-S-Q-LC"
height 0.6
pads (62):
  oval 0.4x2.4 smd: A1(-8.575,-2.9) A2(-7.305,-2.9) A3(-6.035,-2.9) A4(-4.765,-2.9) A5(-3.495,-2.9) A6(-2.225,-2.9) A7(-0.955,-2.9) A8(0.315,-2.9) A9(1.585,-2.9) A10(2.855,-2.9) A11(4.125,-2.9) A12(5.395,-2.9) A13(6.665,-2.9) A14(7.935,-2.9) A15(9.205,-2.9) D1(-9.21,2.9) D2(-7.94,2.9) D3(-6.67,2.9) D4(-5.4,2.9) D5(-4.13,2.9) D6(-2.86,2.9) D7(-1.59,2.9) D8(-0.32,2.9) D9(0.95,2.9) D10(2.22,2.9) D11(3.49,2.9) D12(4.76,2.9) D13(6.03,2.9) D14(7.3,2.9) D15(8.57,2.9)
  oval 0.4x3.6 smd: B1(-9.21,-2.3) B2(-7.94,-2.3) B3(-6.67,-2.3) B4(-5.4,-2.3) B5(-4.13,-2.3) B6(-2.86,-2.3) B7(-1.59,-2.3) B8(-0.32,-2.3) B9(0.95,-2.3) B10(2.22,-2.3) B11(3.49,-2.3) B12(4.76,-2.3) B13(6.03,-2.3) B14(7.3,-2.3) B15(8.57,-2.3) C1(-8.575,2.3) C2(-7.305,2.3) C3(-6.035,2.3) C4(-4.765,2.3) C5(-3.495,2.3) C6(-2.225,2.3) C7(-0.955,2.3) C8(0.315,2.3) C9(1.585,2.3) C10(2.855,2.3) C11(4.125,2.3) C12(5.395,2.3) C13(6.665,2.3) C14(7.935,2.3) C15(9.205,2.3)
  round 1.6 / inner round 1.5 / far side oval 1.6x2.5 hole 1.2: ""(-10.3,0) ""(10.3,0)
Top Overlay:
  circle w0.2: c-10.5,-3.1 r0.2
  lines w0.2: -10.9,-0.7 -10.9,-1.4 -9.9,-1.4 -9.9,-3.3 -9.6,-3.3 ; -10.9,0.7 -10.9,1.4 -9.9,1.4 -9.9,3.3 -9.6,3.3 ; 9.6,-3.3 9.9,-3.3 9.9,-1.4 10.9,-1.4 10.9,-0.7 ; 9.6,3.3 9.9,3.3 9.9,1.4 10.9,1.4 10.9,0.7
3D body "SOLC-115-02-S-Q-LC.stp": height 4.56, standoff -1.41, extent -10.795,-3.556 10.795,3.556